# Altium footprint library Footprints_SOC.PcbLib: 194 footprints (part 11 of 13)
Each footprint in its own frame and in the unit in brackets; x right, y up, seen from the top. Pads: shape width x height; smd on the part's side, far side on the other; paste and mask are expansions set on the pad; w line width, h text height; cw(c..) or ccw(c..) is an arc to the next point about the centre after c.
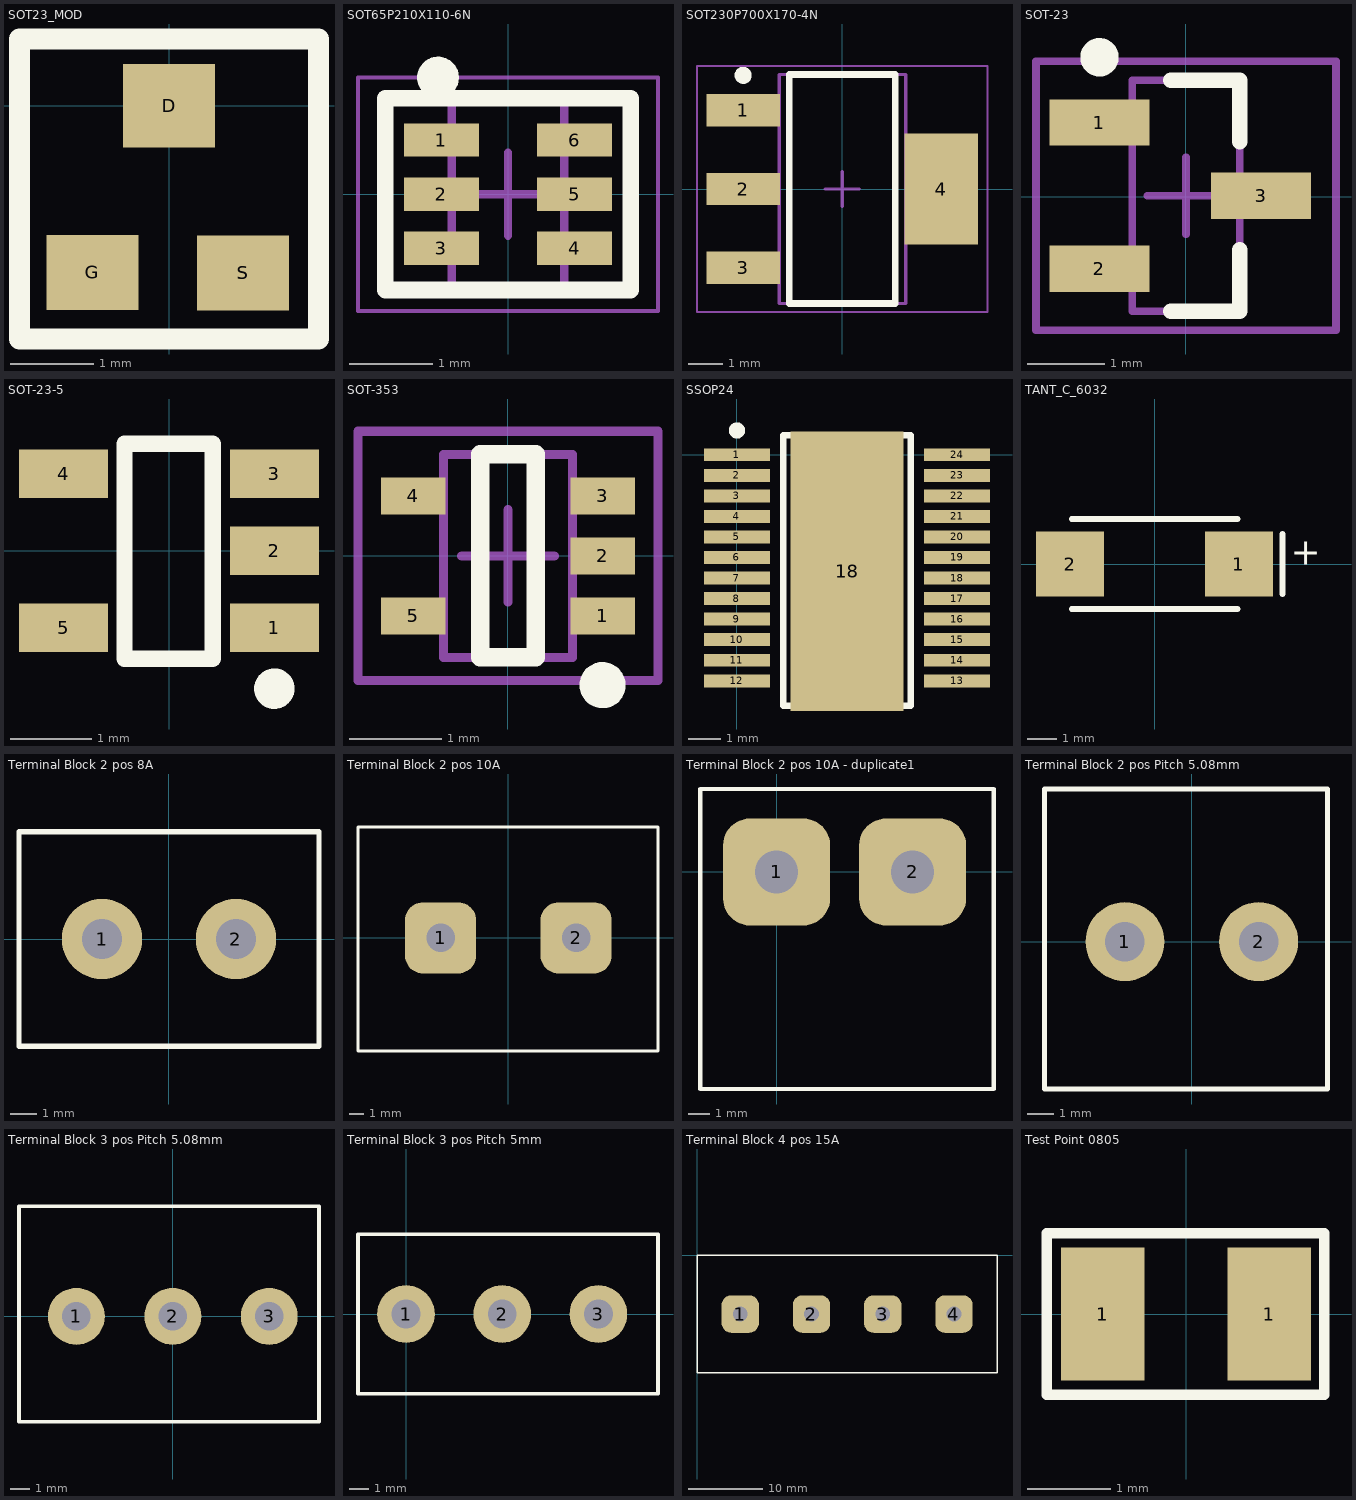
[diagram p10: the footprints below, top view; thin cyan lines are the x and y axes]

## SOT23_MOD [mm]
pads (3):
  rect 1.1x1 smd: D(0,0)
  rect 1.1x0.9 smd: G(-0.918,-2) S(0.889,-2.007)
Top Overlay:
  lines w0.254: -1.792,-2.8 1.792,-2.8 1.792,0.8 -1.792,0.8 -1.792,-2.8
3D body "SOT-23.stp": height 1, standoff 0, extent -1.537,-2.3 1.462,0.25

## SOT65P210X110-6N [mm] "SOT23, 6-Leads, Body 2,03x2,10mm, Pitch 0,65mm, IPC Medium Density"
height 1.1
pads (6):
  rect 0.9x0.4 smd: 1(-0.8,0.65) 2(-0.8,0) 3(-0.8,-0.65) 4(0.8,-0.65) 5(0.8,0) 6(0.8,0.65)
Top Overlay:
  circle w0.25: c-0.839,1.4 r0.125
  lines w0.2: -1.473,-1.15 -1.473,1.15 1.473,1.15 1.473,-1.15 -1.473,-1.15
Mechanical 13:
  lines w0.1: -0.675,-1.125 0.675,-1.125 0.675,1.125 -0.675,1.125 -0.675,-1.125
Mechanical 15:
  lines w0.05: -1.8,-1.4 1.8,-1.4 1.8,1.4 -1.8,1.4 -1.8,-1.4
  lines w0.1: -0.5,0 0.5,0 ; 0,-0.5 0,0.5
3D body: height 1.1, standoff 0.05, extent -0.675,-1.125 0.675,1.125

## SOT230P700X170-4N [mm] "SOT223, 4-Leads, Body 6,50x7,00mm (avg), Pitch 2,30mm, IPC Medium Density"
height 1.7
pads (4):
  rect 2.15x0.95 smd: 1(-2.9,2.3) 2(-2.9,0) 3(-2.9,-2.3)
  rect 2.15x3.25 smd: 4(2.9,0)
Top Overlay:
  circle w0.25: c-2.9,3.325 r0.125
  lines w0.2: -1.55,-3.35 1.55,-3.35 1.55,3.35 -1.55,3.35 -1.55,-3.35
Mechanical 13:
  lines w0.1: -1.85,-3.35 1.85,-3.35 1.85,3.35 -1.85,3.35 -1.85,-3.35
Mechanical 15:
  lines w0.05: -4.25,-3.6 4.25,-3.6 4.25,3.6 -4.25,3.6 -4.25,-3.6
  lines w0.1: -0.5,0 0.5,0 ; 0,-0.5 0,0.5
3D body: height 1.7, standoff 0.02, extent -1.85,-3.35 1.85,3.35

## SOT-23 [mm] "SOT23, 3-Leads, Body 2.9x1.3mm, Pitch 0.95mm, Lead Span 2.5mm, IPC Medium Density"
height 1.1
pads (3):
  rect 1.3x0.6 smd: 1(-1.12,0.96) 2(-1.12,-0.94) 3(0.98,0.01)
Top Overlay:
  circle w0.25: c-1.12,1.81 r0.125
  lines w0.2: -0.195,-1.49 0.705,-1.49 0.705,-0.69 ; -0.195,1.51 0.705,1.51 0.705,0.71
Mechanical 13:
  lines w0.1: -0.695,-1.49 0.705,-1.49 0.705,1.51 -0.695,1.51 -0.695,-1.49
Mechanical 15:
  lines w0.1: -0.495,0.01 0.505,0.01 ; 0.005,-0.49 0.005,0.51 ; -1.945,-1.74 1.955,-1.74 1.955,1.76 -1.945,1.76 -1.945,-1.74
3D body "SOT23-3.stp": height 1.2, standoff 0.02, extent -1.418,-1.5 1.418,1.5

## SOT-23-5 [mm] "SOT353, 5-Leads, Body 2x1.3mm, Pitch 0.65mm, Lead Span 2.1mm, IPC Medium Density"
height 1.1
pads (5):
  rect 1.1x0.6 smd: 1(1.3,-0.95) 2(1.3,0) 3(1.3,0.95) 4(-1.3,0.95) 5(-1.3,-0.95)
Top Overlay:
  circle w0.25: c1.3,-1.7 r0.125
  lines w0.2: -0.55,-1.33 -0.55,1.32 0.54,1.32 0.54,-1.33 -0.55,-1.33
3D body "CircuitWorks-SOT-23-5.STEP": height 1.06, standoff -0.04, extent -1.25,-1.562 1.25,1.438

## SOT-353 [mm] "SOT353, 5-Leads, Body 2x1.3mm, Pitch 0.65mm, Lead Span 2.1mm, IPC Medium Density"
height 1.1
pads (5):
  rect 0.7x0.4 smd: 1(1.025,-0.65) 2(1.025,0) 3(1.025,0.65) 4(-1.025,0.65) 5(-1.025,-0.65)
Top Overlay:
  circle w0.25: c1.025,-1.4 r0.125
  lines w0.2: -0.3,-1.1 -0.3,1.1 0.3,1.1 0.3,-1.1 -0.3,-1.1
Mechanical 13:
  lines w0.1: -0.7,-1.1 0.7,-1.1 0.7,1.1 -0.7,1.1 -0.7,-1.1
Mechanical 15:
  lines w0.1: -0.5,0 0.5,0 ; 0,-0.5 0,0.5 ; -1.625,-1.35 1.625,-1.35 1.625,1.35 -1.625,1.35 -1.625,-1.35
3D body: height 1.1, standoff 0, extent -0.7,-1.1 0.7,1.1

## SSOP24 [mm] "SSOP; 24 Leads; Body Width 5.3 mm; Pitch 0.65 mm"
height 1.99
pads (25):
  rect 2.05x0.4 smd: 1(0,0) 2(0,-0.635) 3(0,-1.27) 4(0,-1.905) 5(0,-2.54) 6(0,-3.175) 7(0,-3.81) 8(0,-4.445) 9(0,-5.08) 10(0,-5.715) 11(0,-6.35) 12(0,-6.985) 13(6.8,-6.985) 14(6.8,-6.35) 15(6.8,-5.715) 16(6.8,-5.08) 17(6.8,-4.445) 18(6.8,-3.81) 19(6.8,-3.175) 20(6.8,-2.54) 21(6.8,-1.905) 22(6.8,-1.27) 23(6.8,-0.635) 24(6.8,0)
  rect 3.5x8.65 smd: 18(3.4,-3.6)
Top Overlay:
  circle w0.25: c0,0.75 r0.125
  lines w0.2: 1.425,-7.75 5.375,-7.75 5.375,0.6 4.058,0.6 cw(c3.4,0.6) 2.742,0.6 1.425,0.6 1.425,-7.75
3D body "NA__NA__MAXIM INTEGRATED__NA__21-0055H_24--3DModel-Eagle-2522 (1).STEP": height 1.76, standoff 0, extent 0.202,-7.888 6.4,0.85

## TANT_C_6032 [mm]
pads (2):
  rect 2.3x2.2 smd: 1(2.85,0) 2(-2.85,0)
Top Overlay:
  lines w0.2: -2.794,-1.524 2.794,-1.524 ; -2.794,1.524 2.794,1.524 ; 4.318,-1.016 4.318,1.016
  text "+" at 4.6,-0.33 h1.52
3D body "TR3 C-CASE.stp": height 2.56, standoff 0.02, extent -3.099,-1.69 3.099,1.663

## Terminal Block 2 pos 8A [mm] "Wurth Electronics Inc. Pitch=5mm"
pads (2):
  round 3 hole 1.5: 1(-2.5,0) 2(2.5,0)
Top Overlay:
  lines w0.2: -5.6,-4 5.6,-4 5.6,4 -5.6,4 -5.6,-4
3D body "Terminal block pitch 5mm 2 pos (691111710002).stp": height 11.35, standoff -3.65, extent -5.6,-4 5.6,4

## Terminal Block 2 pos 10A [mm] "Molex (P/N: 0387206302) Pitch=9.53mm"
pads (2):
  rrect50% 5x5 hole 2: 1(-4.765,0) 2(4.765,0)
Top Overlay:
  lines w0.2: -10.566,-7.95 -10.566,7.798 10.516,7.798 10.516,-7.95 -10.566,-7.95
3D body "Terminal block 2 posiciones 10 A On Shore Technologies.stp": height 16.76, standoff -4.83, extent -10.566,-7.95 10.516,7.798

## Terminal Block 2 pos 10A - duplicate1 [mm] "On Shore Technology Inc. (P/N: OSTYK21102030) Pitch=6.35mm"
pads (2):
  rrect50% 5x5 hole 2: 1(0,0) 2(6.35,0)
Top Overlay:
  lines w0.2: -3.565,-10.13 -3.565,3.87 10.135,3.87 10.135,-10.13 -3.565,-10.13
3D body "OSTYK22102030.stp": height 12.7, standoff -4, extent -3.565,-10.13 10.135,3.87

## Terminal Block 2 pos Pitch 5.08mm [mm] "Wurth Electronics Inc. Pitch=5.08mm"
pads (2):
  round 3 hole 1.5: 1(-2.54,0) 2(2.54,0)
Top Overlay:
  lines w0.2: -5.6,-5.6 5.16,-5.6 5.16,5.8 -5.6,5.8 -5.6,-5.6
3D body "Terminal block 2 pos Pitch 5.08mm (691236510002).stp": height 18, standoff -4, extent -5.6,-5.575 5.16,5.775

## Terminal Block 3 pos Pitch 5.08mm [mm]
pads (3):
  round 3 hole 1.5: 1(-5.08,0) 2(0,0) 3(5.08,0)
Top Overlay:
  lines w0.2: -8.1,-5.55 7.7,-5.55 7.7,5.8 -8.1,5.8 -8.1,-5.55
3D body "Terminal Block 3 pos pitch 5.08mm 691236510003.stp": height 18, standoff -4, extent -8.14,-5.55 7.7,5.8

## Terminal Block 3 pos Pitch 5mm [mm]
pads (3):
  round 3 hole 1.5: 1(0,0) 2(5,0) 3(10,0)
Top Overlay:
  lines w0.2: -2.5,-4.15 -2.5,4.15 13.1,4.15 13.1,-4.15 -2.5,-4.15
3D body "Terminal block 3 posiciones pitch 5mm 691213710003.stp": height 11, standoff -2.8, extent -2.5,-4.15 13.1,4.15

## Terminal Block 4 pos 15A [mm] "Molex"
pads (4):
  rrect50% 5x5 hole 2: 1(5.786,-7.884) 2(15.316,-7.884) 3(24.846,-7.884) 4(34.376,-7.884)
Top Overlay:
  lines w0.2: 0,-15.748 0,0 40.132,0 40.132,-15.748 0,-15.748
3D body "regleta 15A molex 4 posiciones.stp": height 16.76, standoff -4.83, extent 0,-15.748 40.132,0

## Test Point 0805 [mm] "TE Connectivity AMP Connectors P/N: RCT-0C"
pads (2):
  rect 1x1.6 smd: 1(-1,0) 1(1,0)
Top Overlay:
  lines w0.127: -1.67,-0.97 1.66,-0.97 1.66,0.97 -1.67,0.97 -1.67,-0.97
3D body "test point 0805 (Part-Number RCT-0C).stp": height 1.43, standoff -0.02, extent -0.95,-0.635 1.05,0.64